# Altium footprint library ICs And Semiconductors THD.PcbLib: 350 footprints (part 4 of 22)
Each footprint in its own frame and in the unit in brackets; x right, y up, seen from the top. Pads: shape width x height; smd on the part's side, far side on the other; paste and mask are expansions set on the pad; w line width, h text height; cw(c..) or ccw(c..) is an arc to the next point about the centre after c.
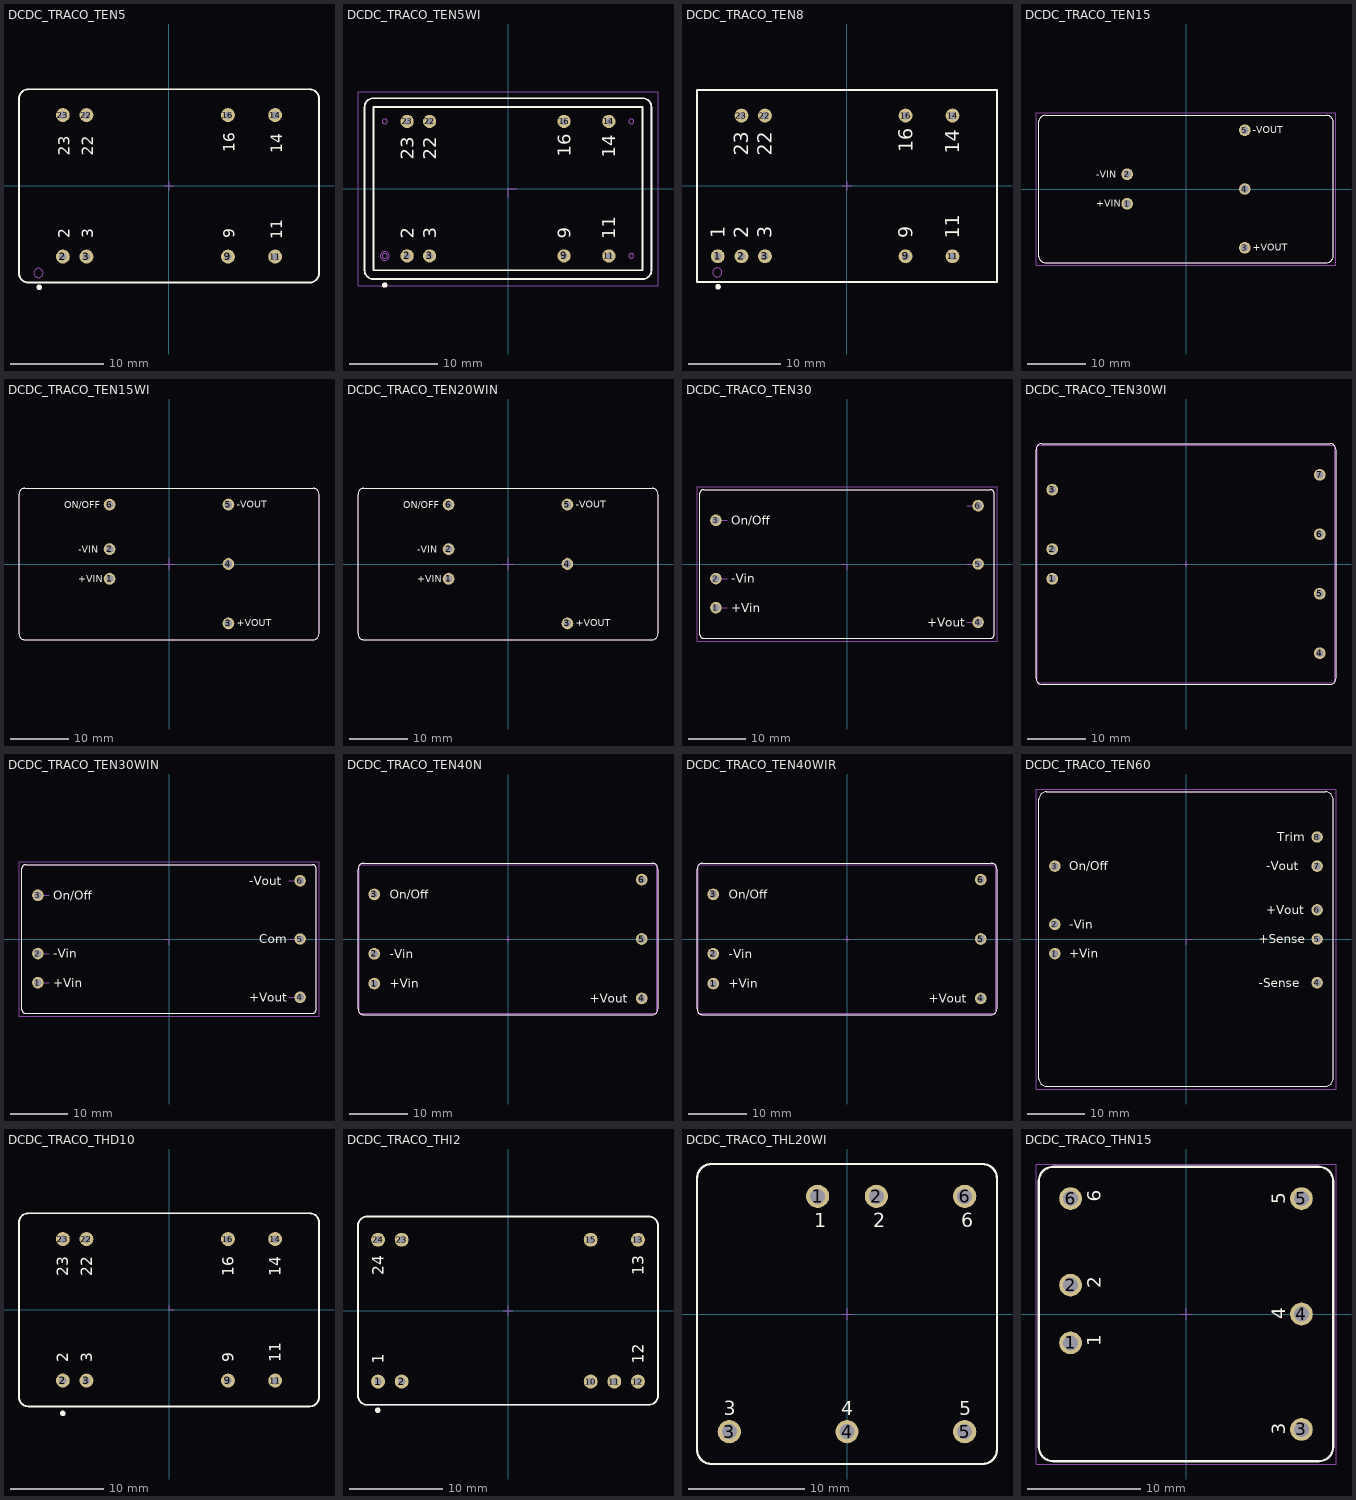
[diagram p3: the footprints below, top view; thin cyan lines are the x and y axes]

## DCDC_TRACO_TEN5 [mm] "TEN 5 Series, Body 31.8x20.3mm"
height 10.7
pads (8):
  round 1.5 hole 0.8: 2(-11.43,-7.62) 3(-8.89,-7.62) 9(6.35,-7.62) 11(11.43,-7.62) 14(11.43,7.62) 16(6.35,7.62) 22(-8.89,7.62) 23(-11.43,7.62)
Top Overlay:
  circle w0.3: c-13.97,-10.922 r0.15
  lines w0.2: -16.15,-9.4 ccw(c-15.15,-9.4) -15.15,-10.4 15.15,-10.4 ccw(c15.15,-9.4) 16.15,-9.4 16.15,9.4 ccw(c15.15,9.4) 15.15,10.4 -15.15,10.4 ccw(c-15.15,9.4) -16.15,9.4 -16.15,-9.4
  text "16" at 7.1,3.632 h1.2
  text "14" at 12.18,3.505 h1.2
  text "22" at -8.14,3.251 h1.2
  text "23" at -10.68,3.251 h1.2
  text "9" at 7.1,-5.663 h1.2
  text "11" at 12.18,-5.737 h1.2
  text "3" at -8.14,-5.663 h1.2
  text "2" at -10.68,-5.663 h1.2
Notvisible:
  lines w0.1: -11.93,-7.62 -11.43,-7.62 ; -11.93,7.62 -11.43,7.62 ; -11.43,-8.12 -11.43,-7.62 ; -11.43,-7.12 -11.43,-7.62 ; -11.43,7.12 -11.43,7.62 ; -11.43,8.12 -11.43,7.62 ; -10.93,-7.62 -11.43,-7.62 ; -10.93,7.62 -11.43,7.62 ; -9.39,-7.62 -8.89,-7.62 ; -9.39,7.62 -8.89,7.62 ; -8.89,-8.12 -8.89,-7.62 ; -8.89,-7.12 -8.89,-7.62 ; -8.89,7.12 -8.89,7.62 ; -8.89,8.12 -8.89,7.62 ; -8.39,-7.62 -8.89,-7.62 ; -8.39,7.62 -8.89,7.62 ; -0.5,0 0,0 ; 0,-0.5 0,0 ; 0,0.5 0,0 ; 0.5,0 0,0 ; 5.85,-7.62 6.35,-7.62 ; 5.85,7.62 6.35,7.62 ; 6.35,-8.12 6.35,-7.62 ; 6.35,-7.12 6.35,-7.62 ; 6.35,7.12 6.35,7.62 ; 6.35,8.12 6.35,7.62 ; 6.85,-7.62 6.35,-7.62 ; 6.85,7.62 6.35,7.62 ; 10.93,-7.62 11.43,-7.62 ; 10.93,7.62 11.43,7.62 ; 11.43,-8.12 11.43,-7.62 ; 11.43,-7.12 11.43,-7.62 ; 11.43,7.12 11.43,7.62 ; 11.43,8.12 11.43,7.62 ; 11.93,-7.62 11.43,-7.62 ; 11.93,7.62 11.43,7.62
Mechanical 14:
  circle w0.1: c-14.045,-9.38 r0.5
  lines w0.1: -16.15,-9.4 ccw(c-15.15,-9.4) -15.15,-10.4 15.15,-10.4 ccw(c15.15,-9.4) 16.15,-9.4 16.15,9.4 ccw(c15.15,9.4) 15.15,10.4 -15.15,10.4 ccw(c-15.15,9.4) -16.15,9.4 -16.15,-9.4
  text "2" at -10.68,-5.663 h1.2
  text "3" at -8.14,-5.663 h1.2
  text "11" at 12.18,-5.737 h1.2
  text "9" at 7.1,-5.663 h1.2
  text "23" at -10.68,3.251 h1.2
  text "22" at -8.14,3.251 h1.2
  text "14" at 12.18,3.505 h1.2
  text "16" at 7.1,3.632 h1.2
3D body "DCDC_TRACO_TEN5.stp": height 10.7, standoff -3.2, extent -16.15,-10.4 16.15,10.4

## DCDC_TRACO_TEN5WI [mm] "TEN 5 Series , Body 32.5x20.5mm, DIP-24 Package with Standard Pinout"
height 10.5
pads (8):
  round 1.5 hole 0.8: 2(-11.43,-7.62) 3(-8.89,-7.62) 9(6.35,-7.62) 11(11.43,-7.62) 14(11.43,7.62) 16(6.35,7.62) 22(-8.89,7.62) 23(-11.43,7.62)
Top Overlay:
  circle w0.3: c-13.97,-10.922 r0.15
  lines w0.2: -16.25,-9.25 ccw(c-15.25,-9.25) -15.25,-10.25 15.25,-10.25 ccw(c15.25,-9.25) 16.25,-9.25 16.25,9.25 ccw(c15.25,9.25) 15.25,10.25 -15.25,10.25 ccw(c-15.25,9.25) -16.25,9.25 -16.25,-9.25 ; -15.25,-9.25 -15.25,9.25 15.25,9.25 15.25,-9.25 -15.25,-9.25
  text "2" at -10.68,-5.663 h1.5
  text "3" at -8.14,-5.663 h1.5
  text "11" at 12.18,-5.737 h1.5
  text "9" at 7.1,-5.663 h1.5
  text "23" at -10.68,3.251 h1.5
  text "22" at -8.14,3.251 h1.5
  text "14" at 12.18,3.505 h1.5
  text "16" at 7.1,3.632 h1.5
Notvisible:
  circle w0.1: c-13.97,-7.62 r0.275
  circle w0.1: c-13.97,7.62 r0.275
  circle w0.1: c13.97,-7.62 r0.275
  circle w0.1: c13.97,7.62 r0.275
  lines w0.1: 0,-1 0,0 1,0
Mechanical 14:
  circle w0.1: c-13.97,-7.63 r0.5
  lines w0.1: -16.25,-9.25 ccw(c-15.25,-9.25) -15.25,-10.25 15.25,-10.25 ccw(c15.25,-9.25) 16.25,-9.25 16.25,9.25 ccw(c15.25,9.25) 15.25,10.25 -15.25,10.25 ccw(c-15.25,9.25) -16.25,9.25 -16.25,-9.25
  text "16" at 7.1,3.632 h1.5
  text "14" at 12.18,3.505 h1.5
  text "22" at -8.14,3.251 h1.5
  text "23" at -10.68,3.251 h1.5
  text "9" at 7.1,-5.663 h1.5
  text "11" at 12.18,-5.737 h1.5
  text "3" at -8.14,-5.663 h1.5
  text "2" at -10.68,-5.663 h1.5
Mechanical 15:
  lines w0.05: -17,-11 17,-11 17,11 -17,11 -17,-11
3D body "DCDC_TRACO_TEN5WI.stp": height 10.5, standoff -3.8, extent -16.25,-10.25 16.25,10.25

## DCDC_TRACO_TEN8 [mm] "TEN 8 Series, Body 32x20.3mm"
height 10.7
pads (9):
  round 1.5 hole 0.8: 1(-14,-7.62) 2(-11.43,-7.62) 3(-8.89,-7.62) 9(6.35,-7.62) 11(11.43,-7.62) 14(11.43,7.62) 16(6.35,7.62) 22(-8.89,7.62) 23(-11.43,7.62)
Top Overlay:
  circle w0.3: c-13.97,-10.922 r0.15
  lines w0.2: -16.25,-10.4 16.25,-10.4 16.25,10.4 -16.25,10.4 -16.25,-10.4
  text "16" at 7.1,3.632 h1.5
  text "14" at 12.18,3.505 h1.5
  text "22" at -8.14,3.251 h1.5
  text "23" at -10.68,3.251 h1.5
  text "9" at 7.1,-5.663 h1.5
  text "11" at 12.18,-5.737 h1.5
  text "3" at -8.14,-5.663 h1.5
  text "2" at -10.68,-5.663 h1.5
  text "1" at -13.22,-5.663 h1.5
Notvisible:
  lines w0.1: -14.5,-7.62 -14,-7.62 ; -14,-8.12 -14,-7.62 ; -14,-7.12 -14,-7.62 ; -13.5,-7.62 -14,-7.62 ; -11.96,-7.62 -11.46,-7.62 ; -11.96,7.62 -11.46,7.62 ; -11.46,-8.12 -11.46,-7.62 ; -11.46,-7.12 -11.46,-7.62 ; -11.46,7.12 -11.46,7.62 ; -11.46,8.12 -11.46,7.62 ; -10.96,-7.62 -11.46,-7.62 ; -10.96,7.62 -11.46,7.62 ; -9.42,-7.62 -8.92,-7.62 ; -9.42,7.62 -8.92,7.62 ; -8.92,-8.12 -8.92,-7.62 ; -8.92,-7.12 -8.92,-7.62 ; -8.92,7.12 -8.92,7.62 ; -8.92,8.12 -8.92,7.62 ; -8.42,-7.62 -8.92,-7.62 ; -8.42,7.62 -8.92,7.62 ; -0.5,0 0,0 ; 0,-0.5 0,0 ; 0,0.5 0,0 ; 0.5,0 0,0 ; 5.82,-7.62 6.32,-7.62 ; 5.82,7.62 6.32,7.62 ; 6.32,-8.12 6.32,-7.62 ; 6.32,-7.12 6.32,-7.62 ; 6.32,7.12 6.32,7.62 ; 6.32,8.12 6.32,7.62 ; 6.82,-7.62 6.32,-7.62 ; 6.82,7.62 6.32,7.62 ; 10.9,-7.62 11.4,-7.62 ; 10.9,7.62 11.4,7.62 ; 11.4,-8.12 11.4,-7.62 ; 11.4,-7.12 11.4,-7.62 ; 11.4,7.12 11.4,7.62 ; 11.4,8.12 11.4,7.62 ; 11.9,-7.62 11.4,-7.62 ; 11.9,7.62 11.4,7.62
Mechanical 14:
  circle w0.1: c-14.045,-9.38 r0.5
  lines w0.1: -16.25,-10.4 16.25,-10.4 16.25,10.4 -16.25,10.4 -16.25,-10.4
  text "2" at -10.68,-5.663 h1.5
  text "3" at -8.14,-5.663 h1.5
  text "11" at 12.18,-5.737 h1.5
  text "9" at 7.1,-5.663 h1.5
  text "23" at -10.68,3.251 h1.5
  text "22" at -8.14,3.251 h1.5
  text "14" at 12.18,3.505 h1.5
  text "16" at 7.1,3.632 h1.5
  text "1" at -13.22,-5.663 h1.5
3D body "DCDC_TRACO_TEN8.stp": height 10.7, standoff -3.8, extent -16.25,-10.4 16.25,10.4

## DCDC_TRACO_TEN15 [mm] "TEN 15 Series , Body 50.8x25.4mm, Height 10.7mm"
height 10.7
pads (5):
  round 2 hole 1.3: 1(-10.16,-2.54) 2(-10.16,2.54) 3(10.16,-10.16) 4(10.16,0) 5(10.16,10.16)
Top Overlay:
  lines w0.2: -25.4,-11.7 ccw(c-24.4,-11.7) -24.4,-12.7 24.4,-12.7 ccw(c24.4,-11.7) 25.4,-11.7 25.4,11.7 ccw(c24.4,11.7) 24.4,12.7 -24.4,12.7 ccw(c-24.4,11.7) -25.4,11.7 -25.4,-11.7
  text "-VIN" at -15.5,1.9 h1.2
  text "-VOUT" at 11.56,9.645 h1.2
  text "+VOUT" at 11.56,-10.675 h1.2
  text "+VIN" at -15.5,-3.1 h1.2
Mechanical 14:
  lines w0.1: -25.4,-11.7 ccw(c-24.4,-11.7) -24.4,-12.7 24.4,-12.7 ccw(c24.4,-11.7) 25.4,-11.7 25.4,11.7 ccw(c24.4,11.7) 24.4,12.7 -24.4,12.7 ccw(c-24.4,11.7) -25.4,11.7 -25.4,-11.7
  text "+VOUT" at 11.56,-10.675 h1.2
  text "-VOUT" at 11.56,9.645 h1.2
  text "+VIN" at -15.5,-3.1 h1.2
  text "-VIN" at -15.5,1.9 h1.2
Mechanical 15:
  lines w0.05: -25.9,-13.2 25.9,-13.2 25.9,13.2 -25.9,13.2 -25.9,-13.2
3D body "DCDC_TRACO_TEN15.stp": height 10.2, standoff -3.8, extent -25.4,-12.7 25.4,12.7

## DCDC_TRACO_TEN15WI [mm] "TEN 15WI Series , Body 50.8x25.4mm, Height 10.2mm"
height 10.2
pads (6):
  round 2 hole 1.3: 1(-10.16,-2.54) 2(-10.16,2.54) 3(10.16,-10.16) 4(10.16,0) 5(10.16,10.16) 6(-10.16,10.16)
Top Overlay:
  lines w0.2: -25.65,-11.95 ccw(c-24.65,-11.95) -24.65,-12.95 24.65,-12.95 ccw(c24.65,-11.95) 25.65,-11.95 25.65,11.95 ccw(c24.65,11.95) 24.65,12.95 -24.65,12.95 ccw(c-24.65,11.95) -25.65,11.95 -25.65,-11.95
  text "ON/OFF" at -17.9,9.52 h1.2
  text "+VIN" at -15.5,-3.1 h1.2
  text "+VOUT" at 11.56,-10.675 h1.2
  text "-VOUT" at 11.56,9.645 h1.2
  text "-VIN" at -15.5,1.9 h1.2
Notvisible:
  lines w0.1: -11.16,-2.5 -10.16,-2.5 ; -11.16,2.58 -10.16,2.58 ; -11.16,10.2 -10.16,10.2 ; -10.16,-3.5 -10.16,-2.5 ; -10.16,-1.5 -10.16,-2.5 ; -10.16,1.58 -10.16,2.58 ; -10.16,3.58 -10.16,2.58 ; -10.16,9.2 -10.16,10.2 ; -10.16,11.2 -10.16,10.2 ; -9.16,-2.5 -10.16,-2.5 ; -9.16,2.58 -10.16,2.58 ; -9.16,10.2 -10.16,10.2 ; -1,0 0,0 ; 0,-1 0,0 ; 0,1 0,0 ; 1,0 0,0 ; 9.16,-10.12 10.16,-10.12 ; 9.16,0.04 10.16,0.04 ; 9.16,10.2 10.16,10.2 ; 10.16,-11.12 10.16,-10.12 ; 10.16,-9.12 10.16,-10.12 ; 10.16,-0.96 10.16,0.04 ; 10.16,1.04 10.16,0.04 ; 10.16,9.2 10.16,10.2 ; 10.16,11.2 10.16,10.2 ; 11.16,-10.12 10.16,-10.12 ; 11.16,0.04 10.16,0.04 ; 11.16,10.2 10.16,10.2
Mechanical 14:
  lines w0.1: -25.65,-11.95 ccw(c-24.65,-11.95) -24.65,-12.95 24.65,-12.95 ccw(c24.65,-11.95) 25.65,-11.95 25.65,11.95 ccw(c24.65,11.95) 24.65,12.95 -24.65,12.95 ccw(c-24.65,11.95) -25.65,11.95 -25.65,-11.95
  text "ON/OFF" at -17.9,9.52 h1.2
  text "-VIN" at -15.5,1.9 h1.2
  text "+VIN" at -15.5,-3.1 h1.2
  text "-VOUT" at 11.56,9.645 h1.2
  text "+VOUT" at 11.56,-10.675 h1.2
3D body "DCDC_TRACO_TEN15WI.stp": height 10.7, standoff -3.8, extent -25.65,-12.95 25.65,12.95

## DCDC_TRACO_TEN20WIN [mm] "TEN 20WIN Series , Body 50.8x25.4mm, Height 10.2mm"
height 10.7
pads (6):
  round 2 hole 1.3: 1(-10.16,-2.54) 2(-10.16,2.54) 3(10.16,-10.16) 4(10.16,0) 5(10.16,10.16) 6(-10.16,10.16)
Top Overlay:
  lines w0.2: -25.65,-11.95 ccw(c-24.65,-11.95) -24.65,-12.95 24.65,-12.95 ccw(c24.65,-11.95) 25.65,-11.95 25.65,11.95 ccw(c24.65,11.95) 24.65,12.95 -24.65,12.95 ccw(c-24.65,11.95) -25.65,11.95 -25.65,-11.95
  text "-VIN" at -15.5,1.9 h1.2
  text "-VOUT" at 11.56,9.645 h1.2
  text "+VOUT" at 11.56,-10.675 h1.2
  text "+VIN" at -15.5,-3.1 h1.2
  text "ON/OFF" at -17.9,9.52 h1.2
Notvisible:
  lines w0.1: -11.16,-2.5 -10.16,-2.5 ; -11.16,2.58 -10.16,2.58 ; -11.16,10.2 -10.16,10.2 ; -10.16,-3.5 -10.16,-2.5 ; -10.16,-1.5 -10.16,-2.5 ; -10.16,1.58 -10.16,2.58 ; -10.16,3.58 -10.16,2.58 ; -10.16,9.2 -10.16,10.2 ; -10.16,11.2 -10.16,10.2 ; -9.16,-2.5 -10.16,-2.5 ; -9.16,2.58 -10.16,2.58 ; -9.16,10.2 -10.16,10.2 ; -1,0 0,0 ; 0,-1 0,0 ; 0,1 0,0 ; 1,0 0,0 ; 9.16,-10.12 10.16,-10.12 ; 9.16,0.04 10.16,0.04 ; 9.16,10.2 10.16,10.2 ; 10.16,-11.12 10.16,-10.12 ; 10.16,-9.12 10.16,-10.12 ; 10.16,-0.96 10.16,0.04 ; 10.16,1.04 10.16,0.04 ; 10.16,9.2 10.16,10.2 ; 10.16,11.2 10.16,10.2 ; 11.16,-10.12 10.16,-10.12 ; 11.16,0.04 10.16,0.04 ; 11.16,10.2 10.16,10.2
Mechanical 14:
  lines w0.1: -25.65,-11.95 ccw(c-24.65,-11.95) -24.65,-12.95 24.65,-12.95 ccw(c24.65,-11.95) 25.65,-11.95 25.65,11.95 ccw(c24.65,11.95) 24.65,12.95 -24.65,12.95 ccw(c-24.65,11.95) -25.65,11.95 -25.65,-11.95
  text "+VOUT" at 11.56,-10.675 h1.2
  text "-VOUT" at 11.56,9.645 h1.2
  text "+VIN" at -15.5,-3.1 h1.2
  text "-VIN" at -15.5,1.9 h1.2
  text "ON/OFF" at -17.9,9.52 h1.2
3D body "DCDC_TRACO_TEN20WIN.stp": height 10.7, standoff -3.8, extent -25.65,-12.95 25.65,12.95

## DCDC_TRACO_TEN30 [mm] "TEN 30 Series , Body 51.3x25.9mm"
height 10.7
pads (6):
  round 2 hole 1.3: 1(-22.86,-7.62) 2(-22.86,-2.54) 3(-22.86,7.62) 4(22.86,-10.16) 5(22.86,0) 6(22.86,10.16)
Top Overlay:
  lines w0.2: -25.65,-12.315 ccw(c-25.015,-12.315) -25.015,-12.95 25.015,-12.95 ccw(c25.015,-12.315) 25.65,-12.315 25.65,12.315 ccw(c25.015,12.315) 25.015,12.95 -25.015,12.95 ccw(c-25.015,12.315) -25.65,12.315 -25.65,-12.315
  text "+Vout" at 13.999,-10.91 h1.5
  text "On/Off" at -20.193,6.87 h1.5
  text "-Vin" at -20.193,-3.29 h1.5
  text "+Vin" at -20.193,-8.37 h1.5
Notvisible:
  lines w0.1: -22.86,-7.62 -20.86,-7.62 ; -22.86,-2.54 -20.86,-2.54 ; -22.86,7.62 -20.86,7.62 ; -1,0 0,0 0,-1 ; 20.86,-10.16 22.86,-10.16 ; 20.86,0 22.86,0 ; 20.86,10.16 22.86,10.16
Mechanical 14:
  lines w0.1: -25.65,-12.315 ccw(c-25.015,-12.315) -25.015,-12.95 25.015,-12.95 ccw(c25.015,-12.315) 25.65,-12.315 25.65,12.315 ccw(c25.015,12.315) 25.015,12.95 -25.015,12.95 ccw(c-25.015,12.315) -25.65,12.315 -25.65,-12.315
Mechanical 15:
  lines w0.05: -26.15,-13.45 26.15,-13.45 26.15,13.45 -26.15,13.45 -26.15,-13.45
3D body "DCDC_TRACO_TEN30.stp": height 10.7, standoff -3.8, extent -25.4,-12.7 25.4,12.7

## DCDC_TRACO_TEN30WI [mm] "TEN 30WI Series , Body 50.8x40.6mm"
height 10.7
pads (7):
  round 2 hole 1.3: 1(-22.86,-2.54) 2(-22.86,2.54) 3(-22.86,12.7) 4(22.86,-15.24) 5(22.86,-5.08) 6(22.86,5.08) 7(22.86,15.24)
Top Overlay:
  lines w0.2: -25.65,-19.57 ccw(c-24.65,-19.57) -24.65,-20.57 24.65,-20.57 ccw(c24.65,-19.57) 25.65,-19.57 25.65,19.57 ccw(c24.65,19.57) 24.65,20.57 -24.65,20.57 ccw(c-24.65,19.57) -25.65,19.57 -25.65,-19.57
Notvisible:
  lines w0.1: -23.36,-2.54 -22.86,-2.54 ; -23.36,2.54 -22.86,2.54 ; -23.36,12.7 -22.86,12.7 ; -22.86,-3.04 -22.86,-2.54 ; -22.86,-2.04 -22.86,-2.54 ; -22.86,2.04 -22.86,2.54 ; -22.86,3.04 -22.86,2.54 ; -22.86,12.2 -22.86,12.7 ; -22.86,13.2 -22.86,12.7 ; -22.36,-2.54 -22.86,-2.54 ; -22.36,2.54 -22.86,2.54 ; -22.36,12.7 -22.86,12.7 ; -0.5,0 0,0 ; 0,-0.5 0,0 ; 0,0.5 0,0 ; 0.5,0 0,0 ; 22.36,-15.24 22.86,-15.24 ; 22.36,-5.08 22.86,-5.08 ; 22.36,5.08 22.86,5.08 ; 22.36,15.24 22.86,15.24 ; 22.86,-15.74 22.86,-15.24 ; 22.86,-14.74 22.86,-15.24 ; 22.86,-5.58 22.86,-5.08 ; 22.86,-4.58 22.86,-5.08 ; 22.86,4.58 22.86,5.08 ; 22.86,5.58 22.86,5.08 ; 22.86,14.74 22.86,15.24 ; 22.86,15.74 22.86,15.24 ; 23.36,-15.24 22.86,-15.24 ; 23.36,-5.08 22.86,-5.08 ; 23.36,5.08 22.86,5.08 ; 23.36,15.24 22.86,15.24 ; -25.4,-20.32 -25.4,20.32 25.4,20.32 25.4,-20.32 -25.4,-20.32
Mechanical 14:
  lines w0.1: -25.65,-19.57 ccw(c-24.65,-19.57) -24.65,-20.57 24.65,-20.57 ccw(c24.65,-19.57) 25.65,-19.57 25.65,19.57 ccw(c24.65,19.57) 24.65,20.57 -24.65,20.57 ccw(c-24.65,19.57) -25.65,19.57 -25.65,-19.57
3D body "DCDC_TRACO_TEN30WI.stp": height 10.7, standoff -3.8, extent -25.65,-20.57 25.65,20.57

## DCDC_TRACO_TEN30WIN [mm] "TEN 30WIN Series , Body 51.3x25.9mm"
height 10.7
pads (6):
  round 2 hole 1.3: 1(-22.86,-7.62) 2(-22.86,-2.54) 3(-22.86,7.62) 4(22.86,-10.16) 5(22.86,0) 6(22.86,10.16)
Top Overlay:
  lines w0.2: -25.65,-12.315 ccw(c-25.015,-12.315) -25.015,-12.95 25.015,-12.95 ccw(c25.015,-12.315) 25.65,-12.315 25.65,12.315 ccw(c25.015,12.315) 25.015,12.95 -25.015,12.95 ccw(c-25.015,12.315) -25.65,12.315 -25.65,-12.315
  text "+Vout" at 13.999,-10.91 h1.5
  text "Com" at 15.769,-0.75 h1.5
  text "-Vout" at 13.999,9.41 h1.5
  text "On/Off" at -20.193,6.87 h1.5
  text "-Vin" at -20.193,-3.29 h1.5
  text "+Vin" at -20.193,-8.37 h1.5
Notvisible:
  circle w0.1: c22.86,10.16 r0.5
  circle w0.1: c22.86,0 r0.5
  circle w0.1: c22.86,-10.16 r0.5
  circle w0.1: c-22.86,-7.62 r0.5
  circle w0.1: c-22.86,-2.54 r0.5
  circle w0.1: c-22.86,7.62 r0.5
  lines w0.1: -22.86,-7.62 -20.86,-7.62 ; -22.86,-2.54 -20.86,-2.54 ; -22.86,7.62 -20.86,7.62 ; -1,0 0,0 0,-1 ; 20.86,-10.16 22.86,-10.16 ; 20.86,0 22.86,0 ; 20.86,10.16 22.86,10.16
Mechanical 14:
  lines w0.1: -25.65,-12.315 ccw(c-25.015,-12.315) -25.015,-12.95 25.015,-12.95 ccw(c25.015,-12.315) 25.65,-12.315 25.65,12.315 ccw(c25.015,12.315) 25.015,12.95 -25.015,12.95 ccw(c-25.015,12.315) -25.65,12.315 -25.65,-12.315
Mechanical 15:
  lines w0.05: -26.15,-13.45 26.15,-13.45 26.15,13.45 -26.15,13.45 -26.15,-13.45
3D body "DCDC_TRACO_TEN30WIN.stp": height 10.7, standoff -3.8, extent -25.4,-12.7 25.4,12.7

## DCDC_TRACO_TEN40N [mm] "TEN 40N Series , Body 50.8x  25.4mm"
height 10.45
pads (6):
  round 2 hole 1.3: 1(-22.86,-7.62) 2(-22.86,-2.54) 3(-22.86,7.62) 4(22.86,-10.16) 5(22.86,0) 6(22.86,10.16)
Top Overlay:
  lines w0.2: -25.65,-11.95 ccw(c-24.65,-11.95) -24.65,-12.95 24.65,-12.95 ccw(c24.65,-11.95) 25.65,-11.95 25.65,11.95 ccw(c24.65,11.95) 24.65,12.95 -24.65,12.95 ccw(c-24.65,11.95) -25.65,11.95 -25.65,-11.95
  text "+Vin" at -20.193,-8.37 h1.5
  text "-Vin" at -20.193,-3.29 h1.5
  text "On/Off" at -20.193,6.87 h1.5
  text "+Vout" at 13.999,-10.91 h1.5
Notvisible:
  lines w0.1: -23.36,-7.62 -22.86,-7.62 ; -23.36,-2.54 -22.86,-2.54 ; -23.36,7.62 -22.86,7.62 ; -22.86,-8.12 -22.86,-7.62 ; -22.86,-7.12 -22.86,-7.62 ; -22.86,-3.04 -22.86,-2.54 ; -22.86,-2.04 -22.86,-2.54 ; -22.86,7.12 -22.86,7.62 ; -22.86,8.12 -22.86,7.62 ; -22.36,-7.62 -22.86,-7.62 ; -22.36,-2.54 -22.86,-2.54 ; -22.36,7.62 -22.86,7.62 ; -0.5,0 0,0 ; 0,-0.5 0,0 ; 0,0.5 0,0 ; 0.5,0 0,0 ; 22.36,-10.16 22.86,-10.16 ; 22.36,0 22.86,0 ; 22.36,10.16 22.86,10.16 ; 22.86,-10.66 22.86,-10.16 ; 22.86,-9.66 22.86,-10.16 ; 22.86,-0.5 22.86,0 ; 22.86,0.5 22.86,0 ; 22.86,9.66 22.86,10.16 ; 22.86,10.66 22.86,10.16 ; 23.36,-10.16 22.86,-10.16 ; 23.36,0 22.86,0 ; 23.36,10.16 22.86,10.16 ; -25.4,-12.7 -25.4,12.7 25.4,12.7 25.4,-12.7 -25.4,-12.7
Mechanical 14:
  lines w0.1: -25.65,-11.95 ccw(c-24.65,-11.95) -24.65,-12.95 24.65,-12.95 ccw(c24.65,-11.95) 25.65,-11.95 25.65,11.95 ccw(c24.65,11.95) 24.65,12.95 -24.65,12.95 ccw(c-24.65,11.95) -25.65,11.95 -25.65,-11.95
3D body "DCDC_TRACO_TEN40N.stp": height 10.45, standoff -3.8, extent -25.65,-12.95 25.65,12.95

## DCDC_TRACO_TEN40WIR [mm] "TEN 40WIR Series , Body 50.8 x  25.4mm"
height 10.7
pads (6):
  round 2 hole 1.3: 1(-22.86,-7.62) 2(-22.86,-2.54) 3(-22.86,7.62) 4(22.86,-10.16) 5(22.86,0) 6(22.86,10.16)
Top Overlay:
  lines w0.2: -25.65,-11.95 ccw(c-24.65,-11.95) -24.65,-12.95 24.65,-12.95 ccw(c24.65,-11.95) 25.65,-11.95 25.65,11.95 ccw(c24.65,11.95) 24.65,12.95 -24.65,12.95 ccw(c-24.65,11.95) -25.65,11.95 -25.65,-11.95
  text "+Vin" at -20.193,-8.37 h1.5
  text "-Vin" at -20.193,-3.29 h1.5
  text "On/Off" at -20.193,6.87 h1.5
  text "+Vout" at 13.999,-10.91 h1.5
Notvisible:
  lines w0.1: -23.36,-7.62 -22.86,-7.62 ; -23.36,-2.54 -22.86,-2.54 ; -23.36,7.62 -22.86,7.62 ; -22.86,-8.12 -22.86,-7.62 ; -22.86,-7.12 -22.86,-7.62 ; -22.86,-3.04 -22.86,-2.54 ; -22.86,-2.04 -22.86,-2.54 ; -22.86,7.12 -22.86,7.62 ; -22.86,8.12 -22.86,7.62 ; -22.36,-7.62 -22.86,-7.62 ; -22.36,-2.54 -22.86,-2.54 ; -22.36,7.62 -22.86,7.62 ; -0.5,0 0,0 ; 0,-0.5 0,0 ; 0,0.5 0,0 ; 0.5,0 0,0 ; 22.36,-10.16 22.86,-10.16 ; 22.36,0 22.86,0 ; 22.36,10.16 22.86,10.16 ; 22.86,-10.66 22.86,-10.16 ; 22.86,-9.66 22.86,-10.16 ; 22.86,-0.5 22.86,0 ; 22.86,0.5 22.86,0 ; 22.86,9.66 22.86,10.16 ; 22.86,10.66 22.86,10.16 ; 23.36,-10.16 22.86,-10.16 ; 23.36,0 22.86,0 ; 23.36,10.16 22.86,10.16 ; -25.4,-12.7 -25.4,12.7 25.4,12.7 25.4,-12.7 -25.4,-12.7
Mechanical 14:
  lines w0.1: -25.65,-11.95 ccw(c-24.65,-11.95) -24.65,-12.95 24.65,-12.95 ccw(c24.65,-11.95) 25.65,-11.95 25.65,11.95 ccw(c24.65,11.95) 24.65,12.95 -24.65,12.95 ccw(c-24.65,11.95) -25.65,11.95 -25.65,-11.95
3D body "DCDC_TRACO_TEN40WIR.stp": height 10.45, standoff -3.8, extent -25.65,-12.95 25.65,12.95

## DCDC_TRACO_TEN60 [mm] "TEN 60 Series , Body 51.3x51.3mm"
height 10.7
pads (8):
  round 2 hole 1.3: 1(-22.86,-2.54) 2(-22.86,2.54) 3(-22.86,12.7) 4(22.86,-7.62) 5(22.86,0) 6(22.86,5.08) 7(22.86,12.7) 8(22.86,17.78)
Top Overlay:
  lines w0.2: -25.65,-24.4 ccw(c-24.4,-24.4) -24.4,-25.65 24.4,-25.65 ccw(c24.4,-24.4) 25.65,-24.4 25.65,24.4 ccw(c24.4,24.4) 24.4,25.65 -24.4,25.65 ccw(c-24.4,24.4) -25.65,24.4 -25.65,-24.4
  text "+Vout" at 13.97,4.33 h1.5
  text "On/Off" at -20.32,11.95 h1.5
  text "-Vin" at -20.32,1.79 h1.5
  text "+Vin" at -20.32,-3.29 h1.5
  text "+Sense" at 12.7,-0.75 h1.5
  text "-Sense" at 12.7,-8.37 h1.5
  text "-Vout" at 13.97,11.95 h1.5
  text "Trim" at 15.875,17.03 h1.5
Notvisible:
  lines w0.1: 0,-1 0,0 1,0
Mechanical 14:
  lines w0.1: -25.65,-24.4 ccw(c-24.4,-24.4) -24.4,-25.65 24.4,-25.65 ccw(c24.4,-24.4) 25.65,-24.4 25.65,24.4 ccw(c24.4,24.4) 24.4,25.65 -24.4,25.65 ccw(c-24.4,24.4) -25.65,24.4 -25.65,-24.4
Mechanical 15:
  lines w0.05: -26.15,-26.15 -26.15,26.15 26.15,26.15 26.15,-26.15 -26.15,-26.15
3D body "DCDC_TRACO_TEN60.stp": height 10.7, standoff -3.8, extent -25.65,-25.65 25.65,25.65

## DCDC_TRACO_THD10 [mm] "THD 10 Series, Body 32.3x20.8mm, Height 10.7mm"
height 10.7
pads (8):
  round 1.5 hole 0.8: 2(-11.43,-7.62) 3(-8.89,-7.62) 9(6.35,-7.62) 11(11.43,-7.62) 14(11.43,7.62) 16(6.35,7.62) 22(-8.89,7.62) 23(-11.43,7.62)
Top Overlay:
  circle w0.3: c-11.43,-11.15 r0.15
  lines w0.2: -16.15,-9.4 ccw(c-15.15,-9.4) -15.15,-10.4 15.15,-10.4 ccw(c15.15,-9.4) 16.15,-9.4 16.15,9.4 ccw(c15.15,9.4) 15.15,10.4 -15.15,10.4 ccw(c-15.15,9.4) -16.15,9.4 -16.15,-9.4
  text "2" at -10.83,-5.62 h1.2
  text "3" at -8.29,-5.62 h1.2
  text "9" at 6.95,-5.62 h1.2
  text "11" at 12.03,-5.62 h1.2
  text "14" at 12.03,3.62 h1.2
  text "16" at 6.95,3.62 h1.2
  text "22" at -8.29,3.62 h1.2
  text "23" at -10.83,3.62 h1.2
Notvisible:
  lines w0.05: -11.43,-7.12 -11.43,-7.62 -10.93,-7.62 ; -11.43,8.12 -11.43,7.62 -10.93,7.62 ; -8.89,-7.12 -8.89,-7.62 -8.39,-7.62 ; -8.89,8.12 -8.89,7.62 -8.39,7.62 ; 0,0.5 0,0 0.5,0 ; 6.35,-7.12 6.35,-7.62 6.85,-7.62 ; 6.35,8.12 6.35,7.62 6.85,7.62 ; 11.43,-7.12 11.43,-7.62 11.93,-7.62 ; 11.43,8.12 11.43,7.62 11.93,7.62
Mechanical 14:
  lines w0.1: -16.15,-9.4 ccw(c-15.15,-9.4) -15.15,-10.4 15.15,-10.4 ccw(c15.15,-9.4) 16.15,-9.4 16.15,9.4 ccw(c15.15,9.4) 15.15,10.4 -15.15,10.4 ccw(c-15.15,9.4) -16.15,9.4 -16.15,-9.4
  text "2" at -10.83,-5.62 h1.2
  text "3" at -8.29,-5.62 h1.2
  text "9" at 6.95,-5.62 h1.2
  text "11" at 12.03,-5.62 h1.2
  text "14" at 12.03,3.62 h1.2
  text "16" at 6.95,3.62 h1.2
  text "22" at -8.29,3.62 h1.2
  text "23" at -10.83,3.62 h1.2
3D body "DCDC_TRACO_THD10.stp": height 10.7, standoff -4.1, extent -16.15,-10.4 16.15,10.4

## DCDC_TRACO_THI2 [mm] "THI Series , Body 32x20mm, Pitch 2.54mm"
height 10.25
pads (9):
  round 1.5 hole 0.8: 1(-13.97,-7.62) 2(-11.43,-7.62) 10(8.89,-7.62) 11(11.43,-7.62) 12(13.97,-7.62) 13(13.97,7.62) 15(8.89,7.62) 23(-11.43,7.62) 24(-13.97,7.62)
Top Overlay:
  circle w0.3: c-14,-10.7 r0.15
  lines w0.2: -16.125,-9.125 ccw(c-15.125,-9.125) -15.125,-10.125 15.125,-10.125 ccw(c15.125,-9.125) 16.125,-9.125 16.125,9.125 ccw(c15.125,9.125) 15.125,10.125 -15.125,10.125 ccw(c-15.125,9.125) -16.125,9.125 -16.125,-9.125
  text "1" at -13.335,-5.715 h1.2
  text "13" at 14.605,3.81 h1.2
  text "24" at -13.335,3.81 h1.2
  text "12" at 14.605,-5.715 h1.2
Notvisible:
  lines w0.1: -14.47,-7.62 -13.97,-7.62 ; -14.47,7.62 -13.97,7.62 ; -13.97,-8.12 -13.97,-7.62 ; -13.97,-7.12 -13.97,-7.62 ; -13.97,7.12 -13.97,7.62 ; -13.97,8.12 -13.97,7.62 ; -13.47,-7.62 -13.97,-7.62 ; -13.47,7.62 -13.97,7.62 ; -11.93,-7.62 -11.43,-7.62 ; -11.93,7.62 -11.43,7.62 ; -11.43,-8.12 -11.43,-7.62 ; -11.43,-7.12 -11.43,-7.62 ; -11.43,7.12 -11.43,7.62 ; -11.43,8.12 -11.43,7.62 ; -10.93,-7.62 -11.43,-7.62 ; -10.93,7.62 -11.43,7.62 ; -0.5,0 0,0 ; 0,-0.5 0,0 ; 0,0.5 0,0 ; 0.5,0 0,0 ; 8.39,-7.62 8.89,-7.62 ; 8.39,7.62 8.89,7.62 ; 8.89,-8.12 8.89,-7.62 ; 8.89,-7.12 8.89,-7.62 ; 8.89,7.12 8.89,7.62 ; 8.89,8.12 8.89,7.62 ; 9.39,-7.62 8.89,-7.62 ; 9.39,7.62 8.89,7.62 ; 10.93,-7.62 11.43,-7.62 ; 11.43,-8.12 11.43,-7.62 ; 11.43,-7.12 11.43,-7.62 ; 11.93,-7.62 11.43,-7.62 ; 13.47,-7.62 13.97,-7.62 ; 13.47,7.62 13.97,7.62 ; 13.97,-8.12 13.97,-7.62 ; 13.97,-7.12 13.97,-7.62 ; 13.97,7.12 13.97,7.62 ; 13.97,8.12 13.97,7.62 ; 14.47,-7.62 13.97,-7.62 ; 14.47,7.62 13.97,7.62
Mechanical 14:
  lines w0.1: -16.125,-9.125 ccw(c-15.125,-9.125) -15.125,-10.125 15.125,-10.125 ccw(c15.125,-9.125) 16.125,-9.125 16.125,9.125 ccw(c15.125,9.125) 15.125,10.125 -15.125,10.125 ccw(c-15.125,9.125) -16.125,9.125 -16.125,-9.125
  text "1" at -13.335,-5.715 h1.2
  text "12" at 14.605,-5.715 h1.2
  text "13" at 14.605,3.81 h1.2
  text "24" at -13.335,3.81 h1.2
3D body "DCDC_TRACO_THI2.stp": height 10.25, standoff -3.8, extent -16.125,-10.125 16.125,10.125

## DCDC_TRACO_THL20WI [mm] "THL 20WI Series , Body 25.4x25.4mm, Height 10.7mm"
height 10.7
pads (6):
  round 2 hole 1.3: 1(-2.54,10.16) 2(2.54,10.16) 3(-10.16,-10.16) 4(0,-10.16) 5(10.16,-10.16) 6(10.16,10.16)
Top Overlay:
  lines w0.2: -12.95,-11.7 ccw(c-11.7,-11.7) -11.7,-12.95 11.7,-12.95 ccw(c11.7,-11.7) 12.95,-11.7 12.95,11.7 ccw(c11.7,11.7) 11.7,12.95 -11.7,12.95 ccw(c-11.7,11.7) -12.95,11.7 -12.95,-11.7
  text "1" at -2.819,7.486 h1.2
  text "2" at 2.261,7.486 h1.2
  text "6" at 9.881,7.486 h1.2
  text "5" at 9.677,-8.756 h1.2
  text "4" at -0.483,-8.756 h1.2
  text "3" at -10.643,-8.756 h1.2
Notvisible:
  lines w0.1: -10.66,-10.16 -10.16,-10.16 ; -10.16,-10.66 -10.16,-10.16 ; -10.16,-9.66 -10.16,-10.16 ; -9.66,-10.16 -10.16,-10.16 ; -3.04,10.16 -2.54,10.16 ; -2.54,9.66 -2.54,10.16 ; -2.54,10.66 -2.54,10.16 ; -2.04,10.16 -2.54,10.16 ; -0.5,-10.16 0,-10.16 ; -0.5,0 0,0 ; 0,-10.66 0,-10.16 ; 0,-9.66 0,-10.16 ; 0,-0.5 0,0 ; 0,0.5 0,0 ; 0.5,-10.16 0,-10.16 ; 0.5,0 0,0 ; 2.04,10.16 2.54,10.16 ; 2.54,9.66 2.54,10.16 ; 2.54,10.66 2.54,10.16 ; 3.04,10.16 2.54,10.16 ; 9.66,-10.16 10.16,-10.16 ; 9.66,10.16 10.16,10.16 ; 10.16,-10.66 10.16,-10.16 ; 10.16,-9.66 10.16,-10.16 ; 10.16,9.66 10.16,10.16 ; 10.16,10.66 10.16,10.16 ; 10.66,-10.16 10.16,-10.16 ; 10.66,10.16 10.16,10.16
Mechanical 14:
  lines w0.1: -12.95,-11.7 ccw(c-11.7,-11.7) -11.7,-12.95 11.7,-12.95 ccw(c11.7,-11.7) 12.95,-11.7 12.95,11.7 ccw(c11.7,11.7) 11.7,12.95 -11.7,12.95 ccw(c-11.7,11.7) -12.95,11.7 -12.95,-11.7
  text "1" at -2.819,7.486 h1.2
  text "2" at 2.261,7.486 h1.2
  text "6" at 9.881,7.486 h1.2
  text "5" at 9.677,-8.756 h1.2
  text "4" at -0.483,-8.756 h1.2
  text "3" at -10.643,-8.756 h1.2
3D body "DCDC_TRACO_THL20WI.stp": height 10.7, standoff -3.6, extent -12.95,-12.95 12.95,12.95

## DCDC_TRACO_THN15 [mm] "THN 15 Series , Body 25.4x25.4mm, Height 9.9mm"
height 9.9
pads (6):
  round 2 hole 1.3: 1(-10.16,-2.54) 2(-10.16,2.54) 3(10.16,-10.16) 4(10.16,0) 5(10.16,10.16) 6(-10.16,10.16)
Top Overlay:
  lines w0.2: -12.95,-11.7 ccw(c-11.7,-11.7) -11.7,-12.95 11.7,-12.95 ccw(c11.7,-11.7) 12.95,-11.7 12.95,11.7 ccw(c11.7,11.7) 11.7,12.95 -11.7,12.95 ccw(c-11.7,11.7) -12.95,11.7 -12.95,-11.7
  text "3" at 8.756,-10.643 h1.2
  text "4" at 8.756,-0.483 h1.2
  text "5" at 8.756,9.677 h1.2
  text "6" at -7.486,9.881 h1.2
  text "2" at -7.486,2.261 h1.2
  text "1" at -7.486,-2.819 h1.2
Notvisible:
  lines w0.1: -10.66,-2.54 -10.16,-2.54 ; -10.66,2.54 -10.16,2.54 ; -10.66,10.16 -10.16,10.16 ; -10.16,-3.04 -10.16,-2.54 ; -10.16,-2.04 -10.16,-2.54 ; -10.16,2.04 -10.16,2.54 ; -10.16,3.04 -10.16,2.54 ; -10.16,9.66 -10.16,10.16 ; -10.16,10.66 -10.16,10.16 ; -9.66,-2.54 -10.16,-2.54 ; -9.66,2.54 -10.16,2.54 ; -9.66,10.16 -10.16,10.16 ; -0.5,0 0,0 ; 0,-0.5 0,0 ; 0,0.5 0,0 ; 0.5,0 0,0 ; 9.66,-10.16 10.16,-10.16 ; 9.66,0 10.16,0 ; 9.66,10.16 10.16,10.16 ; 10.16,-10.66 10.16,-10.16 ; 10.16,-9.66 10.16,-10.16 ; 10.16,-0.5 10.16,0 ; 10.16,0.5 10.16,0 ; 10.16,9.66 10.16,10.16 ; 10.16,10.66 10.16,10.16 ; 10.66,-10.16 10.16,-10.16 ; 10.66,0 10.16,0 ; 10.66,10.16 10.16,10.16
Mechanical 14:
  lines w0.1: -12.95,-11.7 ccw(c-11.7,-11.7) -11.7,-12.95 11.7,-12.95 ccw(c11.7,-11.7) 12.95,-11.7 12.95,11.7 ccw(c11.7,11.7) 11.7,12.95 -11.7,12.95 ccw(c-11.7,11.7) -12.95,11.7 -12.95,-11.7
  text "3" at 8.756,-10.643 h1.2
  text "4" at 8.756,-0.483 h1.2
  text "5" at 8.756,9.677 h1.2
  text "6" at -7.486,9.881 h1.2
  text "2" at -7.486,2.261 h1.2
  text "1" at -7.486,-2.819 h1.2
Mechanical 15:
  lines w0.1: -13.2,-13.2 13.2,-13.2 13.2,13.2 -13.2,13.2 -13.2,-13.2
3D body "DCDC_TRACO_THN15.stp": height 9.9, standoff -3.6, extent -12.95,-12.95 12.95,12.95